# Altium footprint library Kon_Tipk.PCBLIB: 113 footprints (part 2 of 8)
Each footprint in its own frame and in the unit in brackets; x right, y up, seen from the top. Pads: shape width x height; smd on the part's side, far side on the other; paste and mask are expansions set on the pad; w line width, h text height; cw(c..) or ccw(c..) is an arc to the next point about the centre after c.
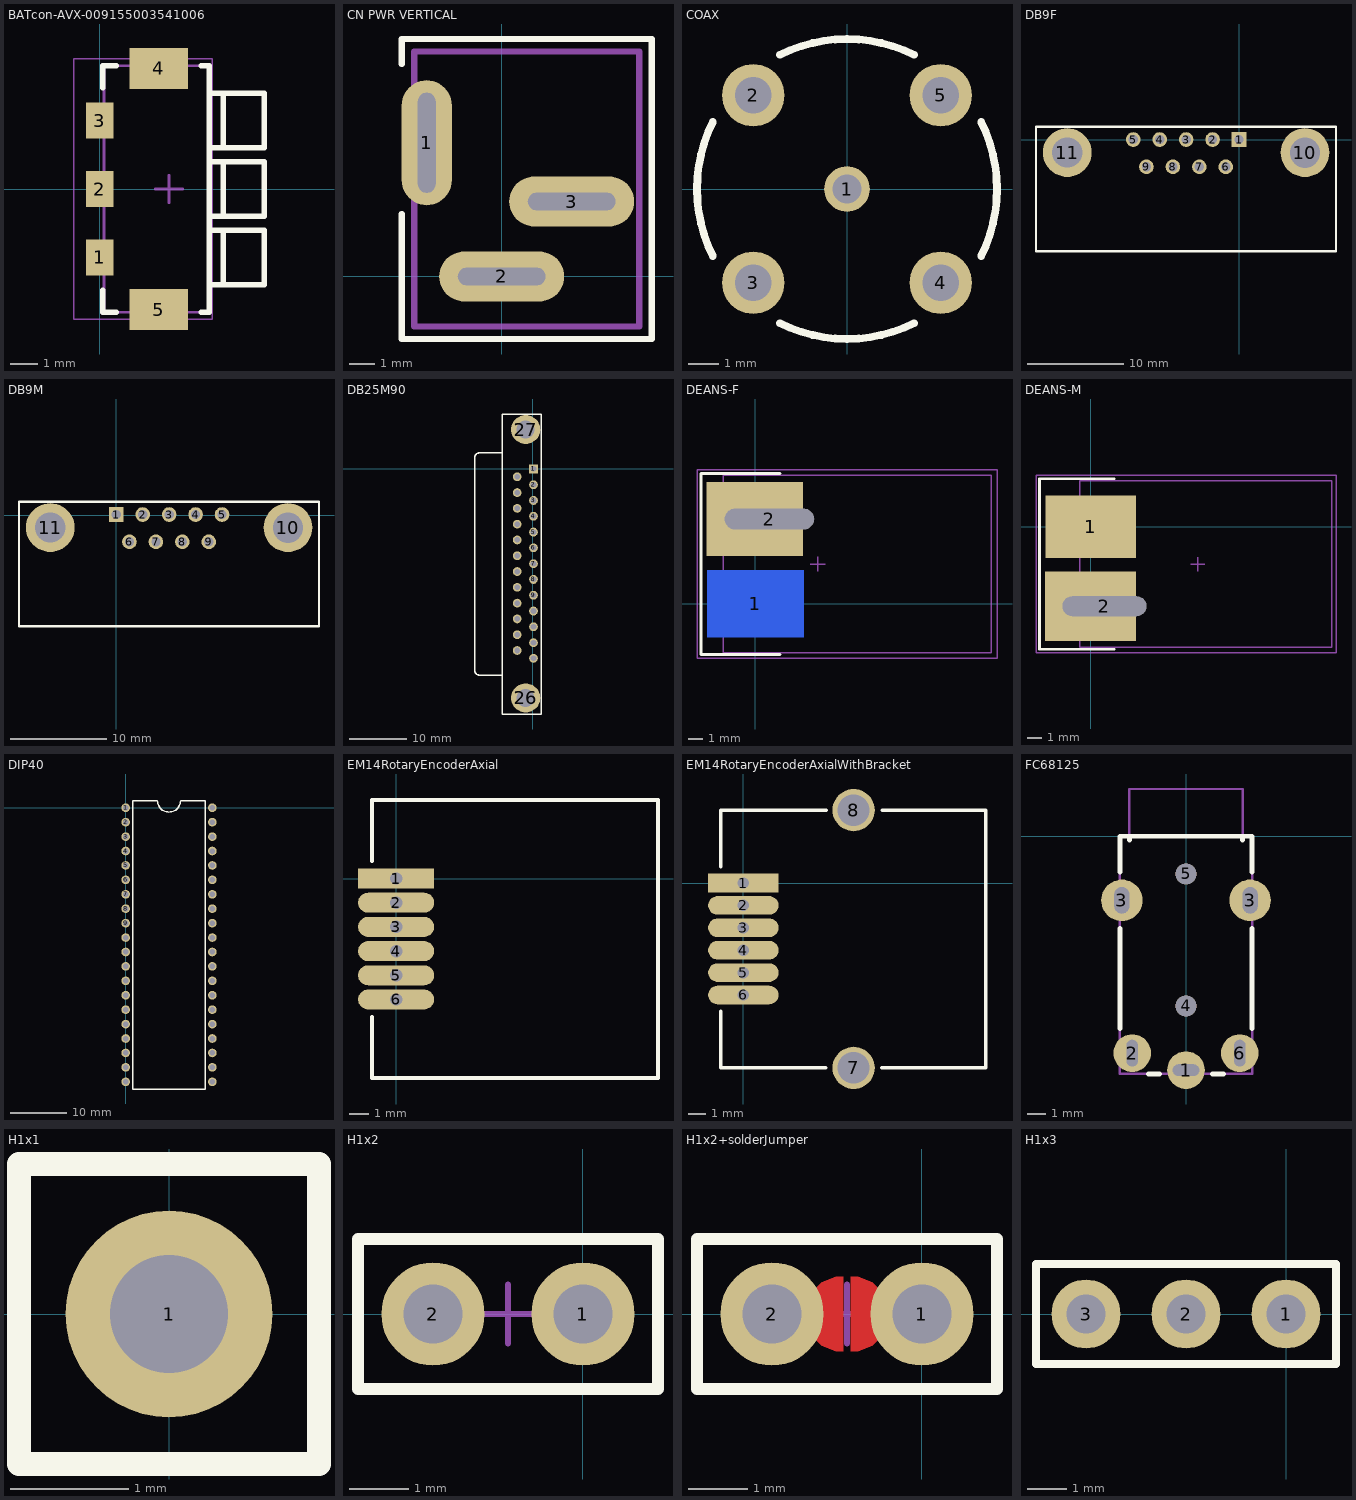
[diagram p1: the footprints below, top view; thin cyan lines are the x and y axes]

## BATcon-AVX-009155003541006 [mm] "9155 MOBO 2.5mm right angle battery connector"
height 3.8
pads (5):
  rect 1x1.3 smd: 1(0,-2.5) 2(0,0) 3(0,2.5)
  rect 2.15x1.5 smd: 4(2.15,4.4) 5(2.15,-4.4)
Top Overlay:
  lines w0.2: 0.1,-3.7 0.1,-4.5 0.6,-4.5 ; 0.1,3.7 0.1,4.5 0.6,4.5 ; 3.7,-4.5 4,-4.5 4,4.5 3.7,4.5 ; 4,-3.5 6,-3.5 6,-1.5 4,-1.5 ; 4,-1 6,-1 6,1 4,1 ; 4,1.5 6,1.5 6,3.5 4,3.5 ; 4.5,-3.5 4.5,-1.5 ; 4.5,-1 4.5,1 ; 4.5,1.5 4.5,3.5
Mechanical 13:
  lines w0.1: 0.15,-4.5 4,-4.5 4,4.5 0.15,4.5 0.15,-4.5
Top Courtyard:
  lines w0.05: -0.95,-4.75 4.1,-4.75 4.1,4.75 -0.95,4.75 -0.95,-4.75
  lines w0.1: 2.022,0 3.022,0 ; 2.522,-0.5 2.522,0.5
3D body: height 3.8, standoff 0, extent 0.522,-4.5 4,4.5

## CN PWR VERTICAL [mm] "FC68146 Power connector, vertical - manually corrected footprint"
height 14
pads (3):
  oval 2x5 hole 0.7 slot 4 at 90 deg: 1(-3,5.35)
  oval 5x2 hole 0.7 slot 3.5 at 0 deg: 2(0,0) 3(2.8,3)
Top Overlay:
  lines w0.254: -4,2.5 -4,-2.5 6,-2.5 6,9.5 -4,9.5 -4,8.5
Mechanical 13:
  lines w0.254: -3.5,-2 5.5,-2 5.5,9 -3.5,9 -3.5,-2
Top Courtyard:
  lines w0.1: -0.5,0 0.5,0 ; 0,-0.5 0,0.5
  lines w0.254: -3.5,-2 -3.5,9 5.5,9 5.5,-2 -3.5,-2
3D body: height 14, standoff 0, extent -3.499,-1.999 5.499,8.999

## COAX [mm]
pads (5):
  round 1.524 hole 0.965: 1(0,0)
  round 2.083 hole 1.2: 2(-3.125,3.125) 3(-3.125,-3.125) 4(3.125,-3.125) 5(3.125,3.125)
Top Overlay:
  lines w0.254: -4.471,-2.239 cw(c0,0) -4.471,2.239 ; -2.239,-4.471 ccw(c0,0) 2.239,-4.471 ; -2.239,4.471 cw(c0,0) 2.239,4.471 ; 4.471,-2.239 ccw(c0,0) 4.471,2.239
3D body "User Library-My BNC Medium.step": height 17.95, standoff -4.4, extent -5.511,-5.511 5.469,5.469

## DB9F [mil]
pads (11):
  rect 60x60 hole 38: 1(0,0)
  round 60 hole 38: 2(-108.26,0) 3(-216.53,0) 4(-324.8,0) 5(-433.07,0) 6(-54.13,-111.81) 7(-162.4,-111.81) 8(-270.67,-111.81) 9(-378.93,-111.81)
  round 200 hole 124: 10(269.93,-53.59) 11(-703.07,-53.55)
Top Overlay:
  lines w10: -831.07,-457.55 -831.07,52.45 396.93,52.45 396.93,-457.55 -831.07,-457.55

## DB9M [mil]
pads (11):
  rect 60x60 hole 38: 1(0,3.54)
  round 60 hole 38: 2(108.27,3.54) 3(216.54,3.54) 4(324.8,3.54) 5(433.07,3.54) 6(54.13,-108.27) 7(162.4,-108.27) 8(270.67,-108.27) 9(378.94,-108.27)
  round 200 hole 124: 10(703,-50.04) 11(-270,-50)
Top Overlay:
  lines w10: -398,-454 830,-454 830,56 -398,56 -398,-454

## DB25M90 [mil]
pads (27):
  rect 60x60 hole 38: 1(3.54,0)
  round 60 hole 38: 2(3.54,-108.27) 3(3.54,-216.54) 4(3.54,-324.8) 5(3.54,-433.07) 6(3.54,-541.34) 7(3.54,-649.61) 8(3.54,-757.87) 9(3.54,-866.14) 10(3.54,-974.41) 11(3.54,-1082.68) 12(3.54,-1190.94) 13(3.54,-1299.21) 14(-108.27,-54.13) 15(-108.27,-162.4) 16(-108.27,-270.67) 17(-108.27,-378.94) 18(-108.27,-487.2) 19(-108.27,-595.47) 20(-108.27,-703.74) 21(-108.27,-812.01) 22(-108.27,-920.28) 23(-108.27,-1028.54) 24(-108.27,-1136.81) 25(-108.27,-1245.08)
  round 200 hole 124: 26(-50,-1570) 27(-50,270)
Top Overlay:
  lines w10: -211.28,-1413.35 -371.56,-1413.35 cw(c-371.56,-1386.63) -398.27,-1386.63 -398.27,82.56 cw(c-371.56,82.56) -371.56,109.27 -211.28,109.27 ; -211.28,-1680.47 -211.28,376.4 55.85,376.4 55.85,-1680.47 -211.28,-1680.47

## DEANS-F [mm]
height 8
pads (2):
  rect 6.5x4.5 smd far side: 1(0,0)
  rect 6.5x5 hole 1.4 slot 6 at 0 deg copper offset -1,0: 2(0.952,5.69)
Top Overlay:
  lines w0.2: 1.663,-3.429 -3.671,-3.429 -3.671,8.763 1.663,8.763
Mechanical 13:
  lines w0.1: -2.147,-3.302 -2.147,8.636 15.887,8.636 15.887,-3.302 -2.147,-3.302
Top Courtyard:
  lines w0.1: 3.703,2.667 4.703,2.667 ; 4.203,2.167 4.203,3.167 ; -3.925,-3.683 16.268,-3.683 16.268,9.017 -3.925,9.017 -3.925,-3.683

## DEANS-M [mm]
height 8
pads (2):
  rect 6.5x4.5 smd: 1(0,0)
  rect 6.5x5 hole 1.4 slot 6 at 0 deg copper offset -1,0: 2(0.977,-5.69)
Top Overlay:
  lines w0.2: 1.663,-8.763 -3.671,-8.763 -3.671,3.429 1.663,3.429
Mechanical 13:
  lines w0.1: -0.775,-8.636 -0.775,3.302 17.247,3.302 17.247,-8.636 -0.775,-8.636
Top Courtyard:
  lines w0.1: 7.157,-2.692 8.157,-2.692 ; 7.657,-3.192 7.657,-2.192 ; -3.925,-9.017 17.551,-9.017 17.551,3.683 -3.925,3.683 -3.925,-9.017
3D body "User Library-Deans.step": height 3.17, standoff -4.13, extent -0.758,-8.687 17.242,3.313

## DIP40 [mil]
pads (40):
  round 60 hole 38: 1(0,0) 2(0,-100) 3(0,-200) 4(0,-300) 5(0,-400) 6(0,-500) 7(0,-600) 8(0,-700) 9(0,-800) 10(0,-900) 11(0,-1000) 12(0,-1100) 13(0,-1200) 14(0,-1300) 15(0,-1400) 16(0,-1500) 17(0,-1600) 18(0,-1700) 19(0,-1800) 20(0,-1900) 21(600,-1900) 22(600,-1800) 23(600,-1700) 24(600,-1600) 25(600,-1500) 26(600,-1400) 27(600,-1300) 28(600,-1200) 29(600,-1100) 30(600,-1000) 31(600,-900) 32(600,-800) 33(600,-700) 34(600,-600) 35(600,-500) 36(600,-400) 37(600,-300) 38(600,-200) 39(600,-100) 40(600,0)
Top Overlay:
  lines w10: 50,-1950 50,50 220,50 ccw(c300,50) 380,50 550,50 550,-1950 50,-1950

## EM14RotaryEncoderAxial [mm]
pads (6):
  rect 4x1.05 hole 0.65: 1(0,0)
  oval 4x1.05 hole 0.65: 2(0,-1.27) 3(0,-2.54) 4(0,-3.81) 5(0,-5.08) 6(0,-6.35)
Top Overlay:
  lines w0.2: -1.27,-7.264 -1.27,-10.48 13.75,-10.48 13.75,4.13 -1.27,4.13 -1.27,0.914

## EM14RotaryEncoderAxialWithBracket [mm]
pads (8):
  rect 4x1.05 hole 0.65: 1(0,0)
  oval 4x1.05 hole 0.65: 2(0,-1.27) 3(0,-2.54) 4(0,-3.81) 5(0,-5.08) 6(0,-6.35)
  round 2.4 hole 1.8: 7(6.25,-10.48) 8(6.25,4.13)
Top Overlay:
  lines w0.2: -1.27,-7.264 -1.27,-10.48 4.663,-10.48 ; -1.27,0.914 -1.27,4.13 4.684,4.13 ; 7.859,-10.48 13.75,-10.48 13.75,4.13 7.864,4.13

## FC68125 [mm] "3.5mm phone jack 4-pole"
height 6
pads (7):
  round 2 hole 0.6 slot 1.4 at 0 deg: 1(0,-12.4)
  round 2 hole 0.6 slot 1.4 at 90 deg: 2(-2.85,-11.5) 6(2.85,-11.5)
  round 2.2 hole 0.8 slot 1.4 at 90 deg: 3(-3.4,-3.4) 3(3.4,-3.4)
  round 1.1 hole 1.1 unplated: 4(0,-9) 5(0,-2)
Top Overlay:
  lines w0.254: -3.505,-10.2 -3.505,-4.9 ; -3.505,-1.9 -3.505,0 3.505,0 3.505,-1.9 ; -3,-0.2 -3,0 ; -2,-12.6 -1.4,-12.6 ; 1.4,-12.6 2,-12.6 ; 3,-0.2 3,0 ; 3.505,-10.2 3.505,-4.9
Mechanical 13:
  lines w0.127: -3.505,-12.6 -3.505,0 -3,0 -3,2.5 3,2.5 3,0 3.505,0 3.505,-12.6 -3.505,-12.6
3D body: height 6, standoff 0, extent -3.504,-12.599 3.504,2.499

## H1x1 [mm]
height 8
pads (1):
  round 1.75 hole 1: 1(0,0)
Top Overlay:
  lines w0.2: -1.27,-1.27 1.27,-1.27 1.27,1.27 -1.27,1.27 -1.27,-1.27
Mechanical 13:
  lines w0.1: -1.27,-1.27 1.27,-1.27 1.27,1.27 -1.27,1.27 -1.27,-1.27
Top Courtyard:
  lines w0.1: -0.5,0 0.5,0 ; 0,-0.5 0,0.5 ; -1.27,-1.27 -1.27,1.27 1.27,1.27 1.27,-1.27 -1.27,-1.27
3D body "Samtec-TSW-101-07-G-S.step": height 8.4, standoff -2.52, extent -1.27,-1.27 1.27,1.27

## H1x2 [mm]
height 8
pads (2):
  round 1.75 hole 1: 1(0,0) 2(-2.54,0)
Top Overlay:
  lines w0.2: -3.81,-1.27 1.27,-1.27 1.27,1.27 -3.81,1.27 -3.81,-1.27
Mechanical 13:
  lines w0.1: -3.81,-1.27 -3.81,1.27 1.27,1.27 1.27,-1.27 -3.81,-1.27
Top Courtyard:
  lines w0.1: -1.77,0 -0.77,0 ; -1.27,-0.5 -1.27,0.5 ; -3.81,-1.27 -3.81,1.27 1.27,1.27 1.27,-1.27 -3.81,-1.27
3D body "Samtec-TSW-101-07-G-S.step": height 8.4, standoff -2.52, extent -3.81,-1.27 -1.27,1.27
3D body "Samtec-TSW-101-07-G-S.step": height 8.4, standoff -2.52, extent -1.27,-1.27 1.27,1.27

## H1x2+solderJumper [mm]
height 8
pads (2):
  round 1.75 hole 1: 1(0,0) 2(-2.54,0)
Top Layer:
  region: -2.921,0.635 -2.032,0.635 -1.778,0.381 -1.778,-0.381 -2.032,-0.635 -2.921,-0.635 -3.175,-0.381 -3.175,0.381
  region: 0.381,0.635 -0.508,0.635 -0.762,0.381 -0.762,-0.381 -0.508,-0.635 0.381,-0.635 0.635,-0.381 0.635,0.381
  region: -1.334,0.635 -1.46,0.635 -1.693,0.538 -1.872,0.36 -1.969,0.126 -1.969,0 -1.969,-0.126 -1.872,-0.36 -1.693,-0.538 -1.46,-0.635 -1.334,-0.635
  region: -1.206,0.635 -1.08,0.635 -0.847,0.538 -0.668,0.36 -0.571,0.126 -0.571,0 -0.571,-0.126 -0.668,-0.36 -0.847,-0.538 -1.08,-0.635 -1.206,-0.635
Top Overlay:
  lines w0.2: -3.81,-1.27 1.27,-1.27 1.27,1.27 -3.81,1.27 -3.81,-1.27
Mechanical 13:
  lines w0.1: -3.81,-1.27 -3.81,1.27 1.27,1.27 1.27,-1.27 -3.81,-1.27
Top Courtyard:
  lines w0.1: -1.77,0 -0.77,0 ; -1.27,-0.5 -1.27,0.5 ; -3.81,-1.27 -3.81,1.27 1.27,1.27 1.27,-1.27 -3.81,-1.27
3D body "Samtec-TSW-101-07-G-S.step": height 8.4, standoff -2.52, extent -3.81,-1.27 -1.27,1.27
3D body "Samtec-TSW-101-07-G-S.step": height 8.4, standoff -2.52, extent -1.27,-1.27 1.27,1.27

## H1x3 [mm]
height 8
pads (3):
  round 1.75 hole 1: 1(0,0) 2(-2.54,0) 3(-5.08,0)
Top Overlay:
  lines w0.2: -6.35,-1.27 1.27,-1.27 1.27,1.27 -6.35,1.27 -6.35,-1.27
Mechanical 13:
  lines w0.1: -6.35,-1.27 -6.35,1.27 1.27,1.27 1.27,-1.27 -6.35,-1.27
Top Courtyard:
  lines w0.1: -3.04,0 -2.04,0 ; -2.54,-0.5 -2.54,0.5 ; -6.35,-1.27 -6.35,1.27 1.27,1.27 1.27,-1.27 -6.35,-1.27
3D body "Samtec-TSW-101-07-G-S.step": height 8.4, standoff -2.52, extent -3.81,-1.27 -1.27,1.27
3D body "Samtec-TSW-101-07-G-S.step": height 8.4, standoff -2.52, extent -1.27,-1.27 1.27,1.27
3D body "Samtec-TSW-101-07-G-S.step": height 8.4, standoff -2.52, extent -6.35,-1.27 -3.81,1.27